# Altium footprint library NDLib.PCBLIB: 499 footprints (part 24 of 32)
Each footprint in its own frame and in the unit in brackets; x right, y up, seen from the top. Pads: shape width x height; smd on the part's side, far side on the other; paste and mask are expansions set on the pad; w line width, h text height; cw(c..) or ccw(c..) is an arc to the next point about the centre after c.
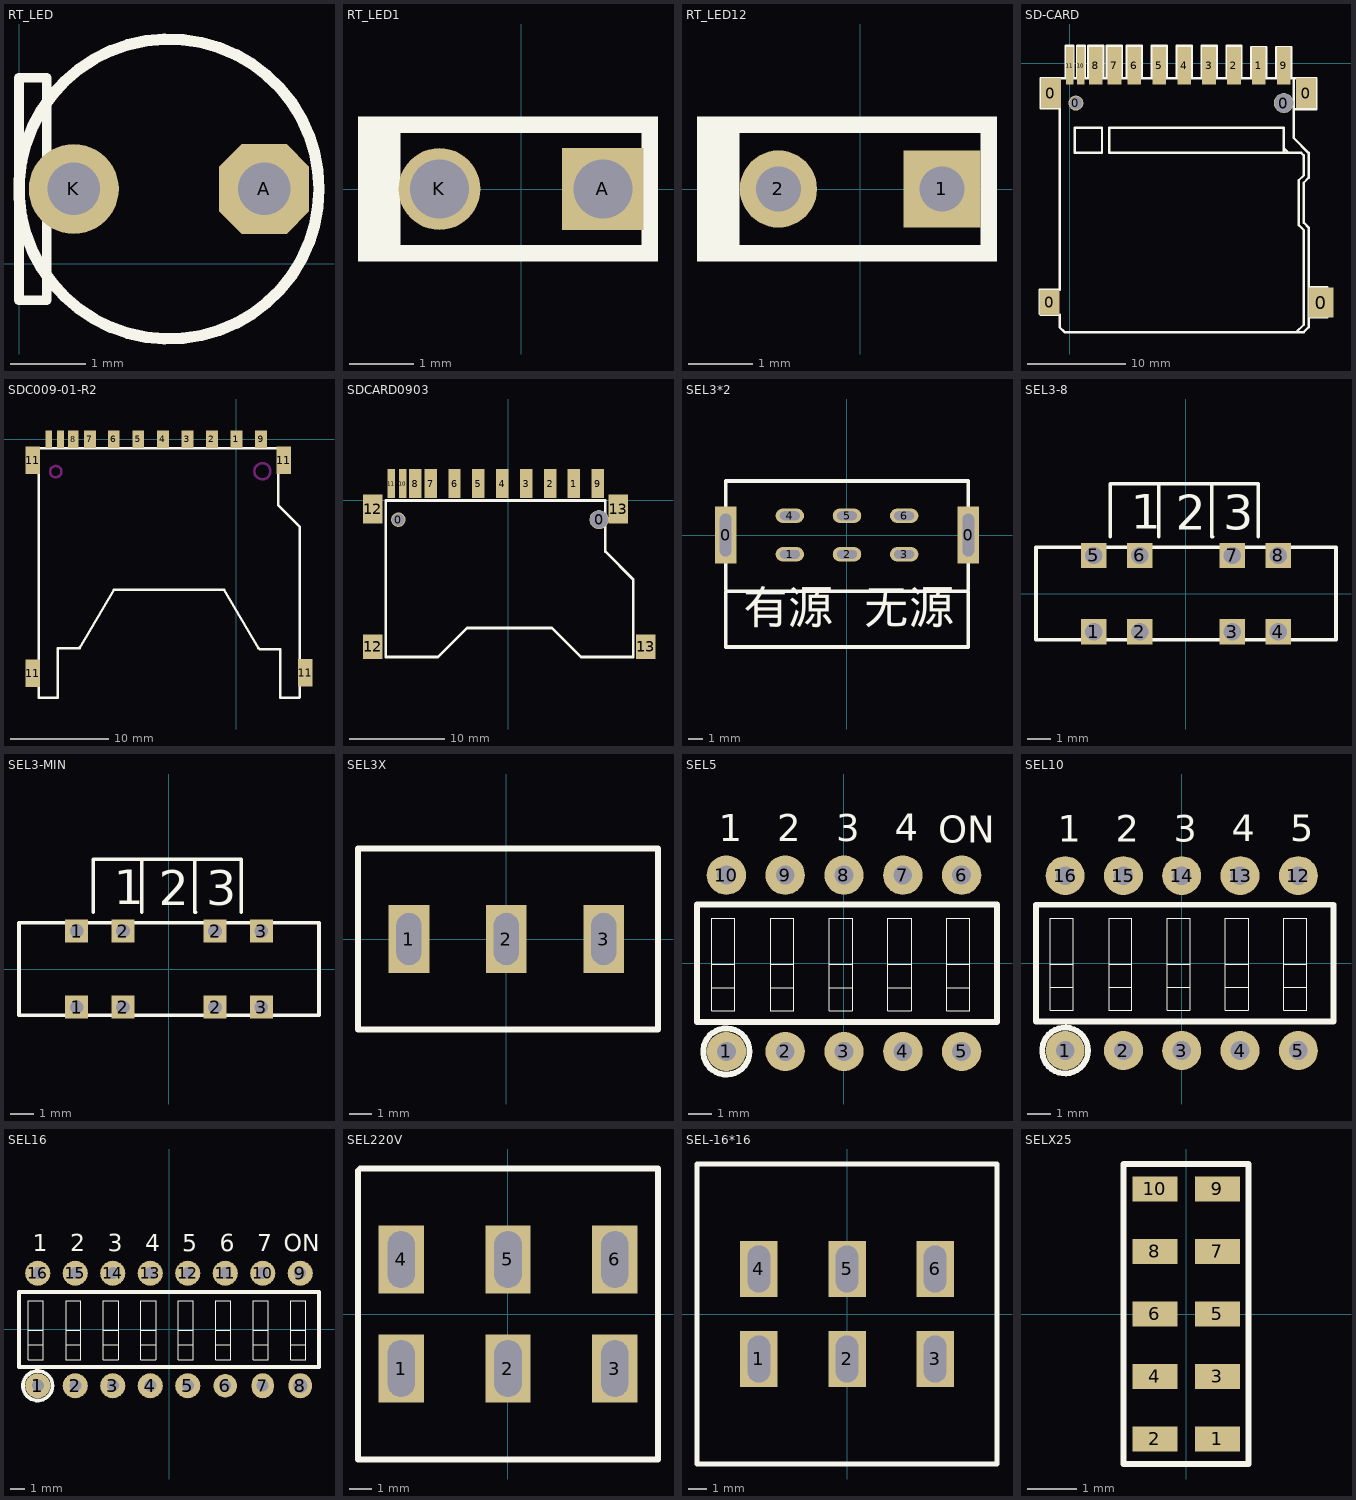
[diagram p23: the footprints below, top view; thin cyan lines are the x and y axes]

## RT_LED [mm]
pads (2):
  oct 1.2x1.2 hole 0.7: A(3.27,1)
  round 1.2 hole 0.7: K(0.73,1)
TopOverlay:
  circle w0.152: c2,1 r2
  lines w0.127: 0,-0.484 0.369,-0.484 0.369,2.482 0,2.482 0,-0.484

## RT_LED1 [mil]
pads (2):
  rect 50x50 hole 36: A(50,0)
  round 50 hole 36: K(-50,0)
TopOverlay:
  rectangle: -99.86,-44.37 -78.74,44.37
  region: 83.74,44.37 78.74,44.37 78.74,-44.37 83.74,-44.37
  lines w10: -78.74,-39.37 -78.74,39.37 78.74,39.37 78.74,-39.37 -78.74,-39.37
3D body: height 236.22, standoff 0, extent -83.74,-44.37 83.74,44.37

## RT_LED12 [mm]
pads (2):
  rect 1.2x1.2 hole 0.7: 1(1.27,0)
  round 1.2 hole 0.7: 2(-1.27,0)
TopOverlay:
  rectangle: -2.537,-1.127 -2,1.127
  region: 2.127,1.127 2,1.127 2,-1.127 2.127,-1.127
  lines w0.254: -2,-1 -2,1 2,1 2,-1 -2,-1
3D body: height 6, standoff 0, extent -2.127,-1.127 2.127,1.127

## SD-CARD [mil] "SD插座1"
pads (17):
  rect 80x100 smd: 0(-80,-960)
  rect 80x120 smd: 0(-75,-120) 0(950,-120)
  round 60 hole 52: 0(25,-160)
  round 80 hole 75: 0(860,-160)
  rect 100x120 smd: 0(1009.63,-960.84)
  rect 55x150 smd: 1(760,-10) 2(660,-10) 3(560,-10) 4(460,-10) 5(360,-10) 6(260,-10) 7(180,-10) 8(105,-10) 9(860,-10)
  rect 30x150 smd: 10(45,-10) 11(0,-10)
TopOverlay:
  lines w10: -15,-60 -15,70 15,70 15,-60 -40,-60 -115,-60 -115,-180 -40,-180 -40,-910 -120,-910 -120,-1005 -115,-1010 -40,-1010 -40,-1060 -20,-1080 -10,-1080 940,-1080 960,-1060 960,-660 940,-640 940,-480 960,-460 960,-450 960,-380 960,-360 900,-300 900,-70 900,-60 ; 10,-60 900,-60 ; 30,-60 30,70 60,70 60,-60 ; 75,-55 75,70 135,70 135,-55 ; 110,-360 130,-360 130,-260 20,-260 20,-360 120,-360 ; 150,-55 150,70 210,70 210,-55 ; 230,-55 230,70 290,70 290,-55 ; 330,-55 330,70 390,70 390,-55 ; 430,-55 430,70 490,70 490,-55 ; 530,-55 530,70 590,70 590,-55 ; 630,-55 630,70 690,70 690,-55 ; 730,-60 730,65 790,65 790,-60 ; 830,-60 830,65 890,65 890,-60 ; 860,-340 880,-360 ; 900,-185 990,-185 990,-60 900,-60 ; 910,-1080 940,-1050 940,-680 940,-670 920,-650 920,-470 940,-450 940,-370 930,-360 860,-360 ; 960,-1020 1035,-1020 ; 960,-900 1035,-900 ; 860,-360 160,-360 160,-260 860,-260 860,-350 860,-360

## SDC009-01-R2 [mm]
pads (15):
  rect 1.2x1.8 smd: 1(0,0) 2(-2.489,0) 3(-4.983,-0.009) 4(-7.483,-0.009) 5(-9.983,-0.009) 6(-12.483,-0.009) 7(-14.908,-0.009) 9(2.517,-0.009)
  rect 1.1x1.8 smd: 8(-16.612,0)
  rect 0.7x1.8 smd: 10(-17.908,-0.009) 12(-19.101,0)
  rect 1.5x2.8 smd: 11(-20.726,-23.834) 11(-20.726,-2.143) 11(4.826,-2.143) 11(7.01,-23.784)
TopOverlay:
  lines w0.254: -18.158,-21.3 -18.158,-26.3 -20.131,-26.3 -20.131,-0.914 -20.117,-0.9 4.242,-0.9 4.242,-6.71 6.431,-8.899 6.442,-8.899 6.442,-26.273 6.415,-26.3 4.442,-26.3 4.442,-21.402 2.4,-21.402 2.242,-21.244 ; -18.107,-21.294 -16.065,-21.294 -15.907,-21.136 ; -15.958,-21.294 -12.446,-15.3 ; -12.458,-15.3 -1.258,-15.3 2.242,-21.294
KeepOutLayer:
  circle w0.254: c-18.39,-3.3 r0.58
  circle w0.254: c2.642,-3.26 r0.82

## SDCARD0903 [mm] "SD卡插座0903"
pads (17):
  round 1.524 hole 1.321: 0(-11.5,-2)
  round 2 hole 1.9: 0(9.5,-2)
  rect 1.3x3 smd: 1(6.875,1.778) 2(4.375,1.778) 3(1.875,1.778) 4(-0.625,1.778) 5(-3.125,1.778) 6(-5.625,1.778) 7(-8.125,1.778) 8(-9.75,1.778) 9(9.375,1.778)
  rect 0.762x3 smd: 10(-11.05,1.778) 11(-12.25,1.778)
  rect 2.032x2.54 smd: 12(-14.2,-15.3) 13(14.4,-15.3)
  rect 2.032x3.048 smd: 12(-14.2,-0.9) 13(11.5,-0.9)
TopOverlay:
  lines w0.279: -12.827,-16.383 -7.366,-16.383 -4.318,-13.335 0,-13.335 4.572,-13.335 7.62,-16.383 13.081,-16.383 13.081,-8.255 10.16,-5.334 10.16,0 -12.827,0 -12.827,-16.383

## SEL3*2 [mm]
pads (8):
  rect 1.5x4 hole 0.8 slot 3 at 90 deg: 0(-8.5,0) 0(8.5,0)
  oval 2x1 hole 0.6 slot 1.4 at 0 deg: 1(-4,-1.35) 2(0,-1.35) 3(4,-1.35) 4(-4,1.35) 5(0,1.35) 6(4,1.35)
TopOverlay:
  lines w0.254: -8.5,-3.779 -8.5,3.78 8.5,3.78 8.5,-3.779 ; -8.5,-7.835 8.5,-7.835 8.5,-3.946 -8.5,-3.946 -8.5,-7.835
  text "无源" at 1.16,-6.929 h4
  text "有源" at -7.299,-6.929 h4

## SEL3-8 [mm]
height 4
pads (8):
  rect 1.1x1.1 hole 0.75: 1(-4,-1.65) 2(-2,-1.65) 3(2,-1.65) 4(4,-1.65) 5(-4,1.65) 6(-2,1.65) 7(2,1.65) 8(4,1.65)
TopOverlay:
  lines w0.152: -3.286,2.463 -3.286,4.76 3.123,4.76 3.123,2.463 ; -1.175,2.463 -1.175,4.76 ; 1.106,4.76 1.106,2.463 1.152,2.463 ; -6.5,-2 -6.5,2 6.5,2 6.5,-2 -6.5,-2
  text "3" at 1.618,2.774 h1.5
  text "2" at -0.446,2.758 h1.5
  text "1" at -2.401,2.805 h1.5

## SEL3-MIN [mm]
pads (8):
  rect 1x1 hole 0.6: 1(-4,-1.65) 1(-4,1.65) 2(-2,-1.65) 2(-2,1.65) 2(2,-1.65) 2(2,1.65) 3(4,-1.65) 3(4,1.65)
TopOverlay:
  lines w0.152: -3.286,2.463 -3.286,4.76 3.123,4.76 3.123,2.463 ; -1.175,2.463 -1.175,4.76 ; 1.106,4.76 1.106,2.463 1.152,2.463 ; -6.5,-2 -6.5,2 6.5,2 6.5,-2 -6.5,-2
  text "3" at 1.618,2.774 h1.5
  text "2" at -0.446,2.758 h1.5
  text "1" at -2.401,2.805 h1.5

## SEL3X [mm]
pads (3):
  rect 1.8x3 hole 1.1 slot 2.3 at 90 deg: 1(-4.3,0) 2(0,0) 3(4.3,0)
TopOverlay:
  lines w0.254: -6.55,-4 6.7,-4 6.7,4 -6.55,4 -6.55,-4

## SEL5 [mm]
height 8
pads (10):
  round 1.7 hole 0.813: 1(-5.08,-3.81) 2(-2.54,-3.81) 3(0,-3.81) 4(2.54,-3.81) 5(5.08,-3.81) 6(5.08,3.81) 7(2.54,3.81) 8(0,3.81) 9(-2.54,3.81) 10(-5.08,3.81)
TopOverlay:
  circle w0.254: c-5.08,-3.81 r1
  lines w0.025: -5.72,-1.05 -4.72,-1.05 ; -5.72,-0.05 -4.72,-0.05 ; -3.18,-1.05 -2.18,-1.05 ; -3.18,-0.05 -2.18,-0.05 ; -0.64,-1.05 0.36,-1.05 ; -0.64,-0.05 0.36,-0.05 ; 1.9,-1.05 2.9,-1.05 ; 1.9,-0.05 2.9,-0.05 ; 4.44,-1.05 5.44,-1.05 ; 4.44,-0.05 5.44,-0.05 ; -5.72,-2.05 -5.72,1.95 -4.72,1.95 -4.72,-2.05 -5.72,-2.05 ; -3.18,-2.05 -3.18,1.95 -2.18,1.95 -2.18,-2.05 -3.18,-2.05 ; -0.64,-2.05 -0.64,1.95 0.36,1.95 0.36,-2.05 -0.64,-2.05 ; 1.9,-2.05 1.9,1.95 2.9,1.95 2.9,-2.05 1.9,-2.05 ; 4.44,-2.05 4.44,1.95 5.44,1.95 5.44,-2.05 4.44,-2.05
  lines w0.254: -6.35,-2.54 6.61,-2.54 6.61,2.54 -6.35,2.54 -6.35,-2.54
  text "ON" at 4.064,4.826 h2
  text "4" at 2.189,4.909 h2
  text "3" at -0.345,4.89 h2
  text "2" at -2.878,4.89 h2
  text "1" at -5.411,4.885 h2

## SEL10 [mm]
height 4
pads (10):
  round 1.7 hole 0.813: 1(-5.08,-3.81) 2(-2.54,-3.81) 3(0,-3.81) 4(2.54,-3.81) 5(5.08,-3.81) 12(5.08,3.81) 13(2.54,3.81) 14(0,3.81) 15(-2.54,3.81) 16(-5.08,3.81)
TopOverlay:
  circle w0.254: c-5.08,-3.81 r1
  lines w0.025: -5.72,-1.05 -4.72,-1.05 ; -5.72,-0.05 -4.72,-0.05 ; -3.18,-1.05 -2.18,-1.05 ; -3.18,-0.05 -2.18,-0.05 ; -0.64,-1.05 0.36,-1.05 ; -0.64,-0.05 0.36,-0.05 ; 1.9,-1.05 2.9,-1.05 ; 1.9,-0.05 2.9,-0.05 ; 4.44,-1.05 5.44,-1.05 ; 4.44,-0.05 5.44,-0.05 ; -5.72,-2.05 -4.72,-2.05 -4.72,1.95 -5.72,1.95 -5.72,-2.05 ; -3.18,-2.05 -2.18,-2.05 -2.18,1.95 -3.18,1.95 -3.18,-2.05 ; -0.64,-2.05 0.36,-2.05 0.36,1.95 -0.64,1.95 -0.64,-2.05 ; 1.9,-2.05 2.9,-2.05 2.9,1.95 1.9,1.95 1.9,-2.05 ; 4.44,-2.05 5.44,-2.05 5.44,1.95 4.44,1.95 4.44,-2.05
  lines w0.254: -6.35,-2.54 -6.35,2.54 6.61,2.54 6.61,-2.54 -6.35,-2.54
  text "1" at -5.411,4.885 h2
  text "2" at -2.878,4.89 h2
  text "3" at -0.345,4.89 h2
  text "4" at 2.189,4.909 h2
  text "5" at 4.722,4.909 h2

## SEL16 [mm]
height 4
pads (16):
  round 1.7 hole 0.813: 1(-8.89,-3.81) 2(-6.35,-3.81) 3(-3.81,-3.81) 4(-1.27,-3.81) 5(1.27,-3.81) 9(8.89,3.81) 10(6.35,3.81) 11(3.81,3.81) 12(1.27,3.81) 13(-1.27,3.81) 14(-3.81,3.81) 15(-6.35,3.81) 16(-8.89,3.81)
  round 1.6 hole 0.813: 6(3.81,-3.81)
  oval 1.5x1.7 hole 0.813: 7(6.35,-3.81)
  oval 1.6x1.7 hole 1: 8(8.89,-3.81)
TopOverlay:
  circle w0.254: c-8.89,-3.81 r1
  lines w0.025: -9.53,-1.05 -8.53,-1.05 ; -9.53,-0.05 -8.53,-0.05 ; -6.99,-1.05 -5.99,-1.05 ; -6.99,-0.05 -5.99,-0.05 ; -4.45,-1.05 -3.45,-1.05 ; -4.45,-0.05 -3.45,-0.05 ; -1.91,-1.05 -0.91,-1.05 ; -1.91,-0.05 -0.91,-0.05 ; 0.63,-1.05 1.63,-1.05 ; 0.63,-0.05 1.63,-0.05 ; 3.17,-1.05 4.17,-1.05 ; 3.17,-0.05 4.17,-0.05 ; 5.71,-1.05 6.71,-1.05 ; 5.71,-0.05 6.71,-0.05 ; 8.25,-1.05 9.25,-1.05 ; 8.25,-0.05 9.25,-0.05 ; -9.53,-2.05 -8.53,-2.05 -8.53,1.95 -9.53,1.95 -9.53,-2.05 ; -6.99,-2.05 -5.99,-2.05 -5.99,1.95 -6.99,1.95 -6.99,-2.05 ; -4.45,-2.05 -3.45,-2.05 -3.45,1.95 -4.45,1.95 -4.45,-2.05 ; -1.91,-2.05 -0.91,-2.05 -0.91,1.95 -1.91,1.95 -1.91,-2.05 ; 0.63,-2.05 1.63,-2.05 1.63,1.95 0.63,1.95 0.63,-2.05 ; 3.17,-2.05 4.17,-2.05 4.17,1.95 3.17,1.95 3.17,-2.05 ; 5.71,-2.05 6.71,-2.05 6.71,1.95 5.71,1.95 5.71,-2.05 ; 8.25,-2.05 9.25,-2.05 9.25,1.95 8.25,1.95 8.25,-2.05
  lines w0.254: -10.16,-2.54 -10.16,2.54 10.16,2.54 10.16,-2.54 -10.16,-2.54
  text "1" at -9.221,4.885 h2
  text "7" at 5.978,4.909 h2
  text "2" at -6.688,4.89 h2
  text "3" at -4.155,4.89 h2
  text "4" at -1.621,4.909 h2
  text "5" at 0.912,4.909 h2
  text "6" at 3.445,4.89 h2
  text "ON" at 7.768,4.89 h2

## SEL220V [mm]
height 8
pads (6):
  rect 2x3 hole 1.2 slot 2.5 at 90 deg: 1(-4.7,-2.4) 2(0,-2.4) 3(4.7,-2.4) 4(-4.7,2.4) 5(0,2.4) 6(4.7,2.4)
TopOverlay:
  lines w0.254: -6.6,-6.4 6.6,-6.4 6.6,6.4 -6.5,6.4 -6.6,6.3 -6.6,-6.4

## SEL-16*16 [mm]
height 8
pads (6):
  rect 2x3 hole 1.2 slot 2.5 at 90 deg: 1(-4.7,-2.4) 2(0,-2.4) 3(4.7,-2.4) 4(-4.7,2.4) 5(0,2.4) 6(4.7,2.4)
TopOverlay:
  lines w0.254: -8,-8 -8,8 8,8 8,-8 -8,-8

## SELX25 [mil]
pads (10):
  rect 36x20 smd: 1(25,-100) 2(-25,-100) 3(25,-50) 4(-25,-50) 5(25,0) 6(-25,0) 7(25,50) 8(-25,50) 9(25,100) 10(-25,100)
TopOverlay:
  lines w5: -50,-120 50,-120 50,120 -50,120 -50,-120